# Altium footprint library TarabusLib_KOR.PcbLib: 560 footprints (part 13 of 35)
Each footprint in its own frame and in the unit in brackets; x right, y up, seen from the top. Pads: shape width x height; smd on the part's side, far side on the other; paste and mask are expansions set on the pad; w line width, h text height; cw(c..) or ccw(c..) is an arc to the next point about the centre after c.
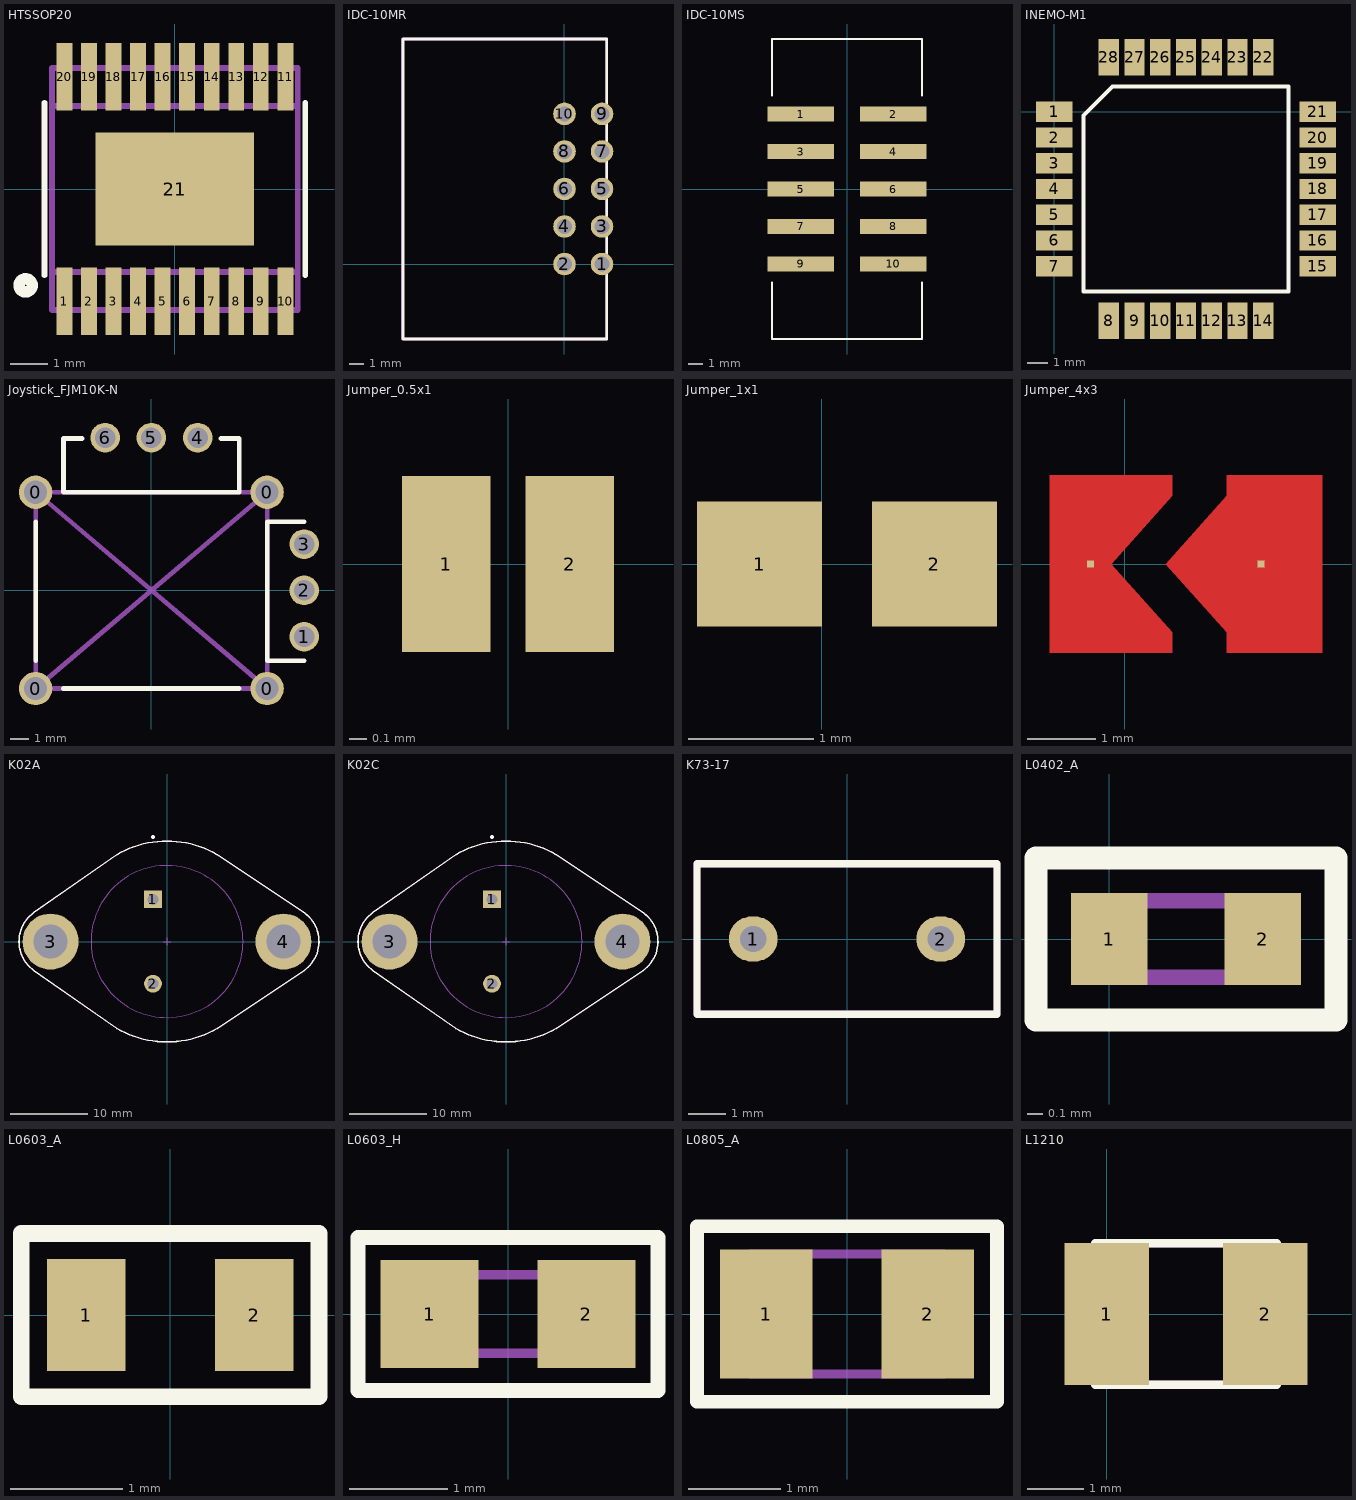
[diagram p12: the footprints below, top view; thin cyan lines are the x and y axes]

## HTSSOP20 [mm]
height 1.1
pads (21):
  rect 0.42x1.78 smd mask+0.075: 1(-2.925,-2.97) 2(-2.275,-2.97) 3(-1.625,-2.97) 4(-0.975,-2.97) 5(-0.325,-2.97) 6(0.325,-2.97) 7(0.975,-2.97) 8(1.625,-2.97) 9(2.275,-2.97) 10(2.925,-2.97) 11(2.925,2.97) 12(2.275,2.97) 13(1.625,2.97) 14(0.975,2.97) 15(0.325,2.97) 16(-0.325,2.97) 17(-0.975,2.97) 18(-1.625,2.97) 19(-2.275,2.97) 20(-2.925,2.97)
  rect 4.2x3 smd mask+0.075: 21(0,-0.002)
Top Overlay:
  circle w0.3: c-3.95,-2.552 r0.175
  lines w0.152: -3.45,-2.284 -3.45,2.284 ; 3.45,-2.284 3.45,2.284
Mechanical 7:
  lines w0.152: -3.25,-2.2 3.25,-2.2 ; -3.25,2.2 3.25,2.2 ; -3.25,-3.2 -3.25,3.2 3.25,3.2 3.25,-3.2 -3.25,-3.2
Mechanical 10:
  text ".Comment" at -1.7,4.45 h1.52
  text ".Designator" at -1.85,-5.225 h1.52
Mechanical 16:
  rectangle: -3.027,2.284 -2.823,3.123
  rectangle: -2.377,2.284 -2.173,3.123
  rectangle: -1.727,2.284 -1.523,3.123
  rectangle: -1.077,2.284 -0.873,3.123
  rectangle: -0.427,2.284 -0.223,3.123
  rectangle: 0.229,2.284 0.432,3.123
  rectangle: 0.889,2.284 1.092,3.123
  rectangle: 1.524,2.284 1.727,3.123
  rectangle: 2.184,2.284 2.388,3.123
  rectangle: 2.845,2.284 3.048,3.123
  rectangle: 2.845,-3.123 3.048,-2.284
  rectangle: 2.184,-3.123 2.388,-2.284
  rectangle: 1.524,-3.123 1.727,-2.284
  rectangle: 0.889,-3.123 1.092,-2.284
  rectangle: 0.229,-3.123 0.432,-2.284
  rectangle: -0.427,-3.123 -0.223,-2.284
  rectangle: -1.077,-3.123 -0.873,-2.284
  rectangle: -1.727,-3.123 -1.523,-2.284
  rectangle: -2.377,-3.123 -2.173,-2.284
  rectangle: -3.027,-3.123 -2.823,-2.284
3D body: height 1.1, standoff 0.05, extent -3.25,-2.2 3.25,2.2
3D body: height 0.5, standoff 0.05, extent -3.25,2.2 3.25,3.2
3D body: height 0.5, standoff 0.05, extent -3.25,-3.2 3.25,-2.2

## IDC-10MR [mil]
pads (10):
  round 60 hole 39.37: 1(100,0) 2(0,0) 3(100,100) 4(0,100) 5(100,200) 6(0,200) 7(100,300) 8(0,300) 9(100,400) 10(0,400)
Top Overlay:
  lines w7.87: -430.71,-199.61 -430.71,599.61 112.6,599.61 112.6,-199.61 -430.71,-199.61
Mechanical 7:
  lines w7.87: -431.1,-199.8 112.2,-199.8 112.2,599.41 -431.1,599.41 -431.1,-199.8
Mechanical 10:
  text ".Comment" at -295.28,673.23 h39.37
  text ".Designator" at -299.21,629.92 h39.37
3D body "header_awhw10a-0502-t.stp": height 350.39, standoff -123.03, extent -440.62,-200.79 117.78,599.21

## IDC-10MS [mm]
pads (10):
  rect 4.5x1 smd: 1(-3.125,5.08) 2(3.125,5.08) 3(-3.125,2.54) 4(3.125,2.54) 5(-3.125,0) 6(3.125,0) 7(-3.125,-2.54) 8(3.125,-2.54) 9(-3.125,-5.08) 10(3.125,-5.08)
Top Overlay:
  lines w0.15: -5.08,-6.35 -5.08,-10.16 5.08,-10.16 5.08,-6.35 ; -5.08,6.35 -5.08,10.16 5.08,10.16 5.08,6.35
Mechanical 7:
  lines w0.15: -5.08,-6.35 -5.08,-10.16 5.08,-10.16 5.08,-6.35 ; -5.08,6.35 -5.08,10.16 5.08,10.16 5.08,6.35
3D body "IDC-10MS.stp": height 10.6, standoff -0.04, extent -4.825,-10.16 4.675,10.16

## INEMO-M1 [mm]
pads (28):
  rect 1.8x1 smd: 1(0,0) 2(0,-1.27) 3(0,-2.54) 4(0,-3.81) 5(0,-5.08) 6(0,-6.35) 7(0,-7.62) 15(13,-7.62) 16(13,-6.35) 17(13,-5.08) 18(13,-3.81) 19(13,-2.54) 20(13,-1.27) 21(13,0)
  rect 1x1.8 smd: 8(2.69,-10.31) 9(3.96,-10.31) 10(5.23,-10.31) 11(6.5,-10.31) 12(7.77,-10.31) 13(9.04,-10.31) 14(10.31,-10.31) 22(10.31,2.69) 23(9.04,2.69) 24(7.77,2.69) 25(6.5,2.69) 26(5.23,2.69) 27(3.96,2.69) 28(2.69,2.69)
Top Overlay:
  lines w0.2: 1.435,-8.875 11.565,-8.875 11.565,1.255 2.87,1.255 1.435,-0.18 1.435,-8.875
3D body "INEMO-M1.STEP": height 2.3, standoff 0, extent -0.025,-10.325 12.975,2.675

## Joystick_FJM10K-N [mm]
pads (10):
  round 1.8 hole 1.25: 0(-6.25,-5.311) 0(-6.25,5.289) 0(6.25,-5.311) 0(6.25,5.289)
  round 1.6 hole 1.1: 1(8.25,-2.511) 2(8.25,-0.011) 3(8.25,2.489) 4(2.5,8.239) 5(0,8.239) 6(-2.5,8.239)
Top Overlay:
  lines w0.254: -6.25,-3.811 -6.25,3.689 ; -4.75,-5.311 4.75,-5.311 ; -3.75,8.189 -4.75,8.189 -4.75,5.289 4.75,5.289 4.75,8.189 3.75,8.189 ; 8.25,-3.811 6.25,-3.811 6.25,3.689 8.25,3.689
Mechanical 7:
  lines w0.254: -6.225,5.289 6.25,-5.311 ; -6.25,-5.311 6.25,-5.311 ; -6.25,-5.311 -6.25,5.289 6.25,5.289 ; -6.25,-5.311 6.25,5.289 ; 6.25,-5.311 6.25,5.289
3D body "Основание джостика.STEP": height 18, standoff -3.7, extent -6.775,-6.536 10.275,10.264

## Jumper_0.5x1 [mm]
pads (2):
  rect 0.5x1 smd mask+0.1: 1(-0.35,0) 2(0.35,0)

## Jumper_1x1 [mm] "1x1"
pads (2):
  rect 1x1 smd mask+0.2: 1(-0.5,0) 2(0.9,0)

## Jumper_4x3 [mm] "4x3"
pads (2):
  rect 0.1x0.1 smd: 1(-0.5,0) 2(2,0)
Top Layer:
  region: 1.5,1.3 1.5,1 0.6,0 1.5,-1 1.5,-1.3 2.9,-1.3 2.9,1.3
  region: -1.1,1.3 -1.1,-1.3 0.7,-1.3 0.7,-1 -0.2,0 0.7,1 0.7,1.3
Top Solder:
  region: -1.3,1.5 -1.3,-1.5 3.1,-1.5 3.1,1.5

## K02A [mm] "Oval Flange Mount with (2) Offset Leads; Pin Spacing 10.93 mm; Lead Dia. 1.09 mm (max)"
height 8.94
pads (4):
  rect 2.3x2.3 hole 1.4: 1(-1.815,5.46)
  round 2.3 hole 1.4: 2(-1.815,-5.46)
  round 7.25 hole 4.4: 3(-15.075,0) 4(15.075,0)
Top Overlay:
  circle w0.25: c-1.815,13.53 r0.125
  lines w0.2: -17.2,-3.767 cw(c-14.561,0.001) -17.2,3.769 -6.5,11.258 cw(c0,0) 6.5,11.258 17.58,3.858 cw(c15.075,0) 17.713,-3.768 6.5,-11.258 cw(c0,0) -6.5,-11.258 -17.2,-3.767
Mechanical 13:
  circle w0.1: c0,0 r9.84
  lines w0.1: -17.2,-3.767 cw(c-14.561,0.001) -17.2,3.769 -6.5,11.258 cw(c0,0) 6.5,11.258 17.58,3.858 cw(c15.075,0) 17.713,-3.768 6.5,-11.258 cw(c0,0) -6.5,-11.258 -17.2,-3.767
Mechanical 15:
  lines w0.1: -0.5,0 0.5,0 ; 0,-0.5 0,0.5
3D body: height 8.94, standoff 1.77, extent -9.839,-9.839 9.839,9.839
3D body: height 1.77, standoff 0, extent -19.162,-13.001 19.676,13.001

## K02C [mm] "Oval Flange Mount with (2) Offset Leads; Pin Spacing 10.93 mm; Lead Dia. 1.09 mm (max)"
height 7.74
pads (4):
  rect 2.3x2.3 hole 1.4: 1(-1.815,5.46)
  round 2.3 hole 1.4: 2(-1.815,-5.46)
  round 7.25 hole 4.4: 3(-15.075,0) 4(15.075,0)
Top Overlay:
  circle w0.25: c-1.815,13.53 r0.125
  lines w0.2: -17.2,-3.767 cw(c-14.561,0.001) -17.2,3.769 -6.5,11.258 cw(c0,0) 6.5,11.258 17.58,3.858 cw(c15.075,0) 17.713,-3.768 6.5,-11.258 cw(c0,0) -6.5,-11.258 -17.2,-3.767
Mechanical 13:
  circle w0.1: c0,0 r9.84
  lines w0.1: -17.2,-3.767 cw(c-14.561,0.001) -17.2,3.769 -6.5,11.258 cw(c0,0) 6.5,11.258 17.58,3.858 cw(c15.075,0) 17.713,-3.768 6.5,-11.258 cw(c0,0) -6.5,-11.258 -17.2,-3.767
Mechanical 15:
  lines w0.1: -0.5,0 0.5,0 ; 0,-0.5 0,0.5
3D body: height 7.74, standoff 1.77, extent -9.839,-9.839 9.839,9.839
3D body: height 1.77, standoff 0, extent -19.162,-13.001 19.676,13.001

## K73-17 [mm]
pads (2):
  oval 1.3x1.2 hole 0.7: 1(-2.5,0) 2(2.5,0)
Top Overlay:
  lines w0.2: -4,-2 4,-2 4,2 -4,2 -4,-2
Mechanical 7:
  lines w0.2: -4,-2 -4,2 4,2 4,-2 -4,-2
Mechanical 10:
  text ".Comment" at 1,-3 h0.6
  text ".Designator" at 0.4,2.4 h0.8

## L0402_A [mm]
pads (2):
  rect 0.5x0.6 smd: 1(0,0) 2(1,0)
Top Overlay:
  lines w0.15: -0.48,-0.53 1.48,-0.53 1.48,0.53 -0.48,0.53 -0.48,-0.53
Mechanical 7:
  lines w0.1: 0,-0.25 0,0.25 1,0.25 1,-0.25 0,-0.25
Mechanical 10:
  text ".Comment" at -0.08,-1.11 h0.6
  text ".Designator" at -0.08,0.75 h0.8
3D body: height 0.35, standoff 0, extent 0,-0.25 1,0.25

## L0603_A [mm]
height 0.8
pads (2):
  rect 0.7x1 smd: 1(-0.75,0) 2(0.75,0)
Top Overlay:
  lines w0.15: -1.33,-0.73 1.33,-0.73 1.33,0.73 -1.33,0.73 -1.33,-0.73
Mechanical 9:
  text ".Designator" at -0.95,0 h0.8
  text ".Comment" at -0.75,-1.225 h0.6
Mechanical 11:
  lines w0.1: -1.35,-0.725 -1.35,0.75 1.325,0.75 1.325,-0.725 -1.35,-0.725
3D body "SMD_0603.step": height 0.9, standoff 0, extent -0.825,-0.425 0.775,0.375

## L0603_H [mm]
height 0.8
pads (2):
  rect 1x1.1 smd: 1(-0.8,0) 2(0.8,0)
Top Overlay:
  lines w0.15: -1.53,-0.78 -1.53,0.78 1.53,0.78 1.53,-0.78 -1.53,-0.78
Mechanical 7:
  lines w0.1: -0.8,-0.4 0.8,-0.4 0.8,0.4 -0.8,0.4 -0.8,-0.4
Mechanical 10:
  text ".Designator" at -0.62,1 h0.8
  text ".Comment" at -0.61,-1.33 h0.6
3D body: height 0.8, standoff 0, extent -0.8,-0.4 0.8,0.4

## L0805_A [mm]
height 1.4
pads (2):
  rect 1x1.4 smd: 1(-0.875,0) 2(0.875,0)
Top Overlay:
  lines w0.15: -1.625,-0.95 -1.625,0.95 1.625,0.95 1.625,-0.95 -1.625,-0.95
Mechanical 7:
  lines w0.1: -1.05,-0.65 -1.05,0.65 1.05,0.65 1.05,-0.65 -1.05,-0.65
Mechanical 10:
  text ".Designator" at -1.525,1.375 h0.8
  text ".Comment" at -1.125,-1.625 h0.6
3D body: height 1.4, standoff 0, extent -1.05,-0.65 1.05,0.65

## L1210 [mm]
pads (2):
  rect 1.5x2.5 smd: 1(0,0) 2(2.8,0)
Top Overlay:
  lines w0.15: -0.2,-1.25 -0.2,1.25 3,1.25 3,-1.25 -0.2,-1.25
Mechanical 7:
  lines w0.15: -0.2,-1.25 3,-1.25 3,1.25 -0.2,1.25 -0.2,-1.25
Mechanical 10:
  text ".Comment" at -0.527,2.281 h1
  text ".Designator" at -0.4,1.5 h1
3D body "LQH32M-1.STEP": height 1.95, standoff -0.05, extent -0.191,-1.238 3.009,1.262